# Altium footprint library ICs And Semiconductors THD.PcbLib: 507 footprints (part 26 of 32)
Each footprint in its own frame and in the unit in brackets; x right, y up, seen from the top. Pads: shape width x height; smd on the part's side, far side on the other; paste and mask are expansions set on the pad; w line width, h text height; cw(c..) or ccw(c..) is an arc to the next point about the centre after c.
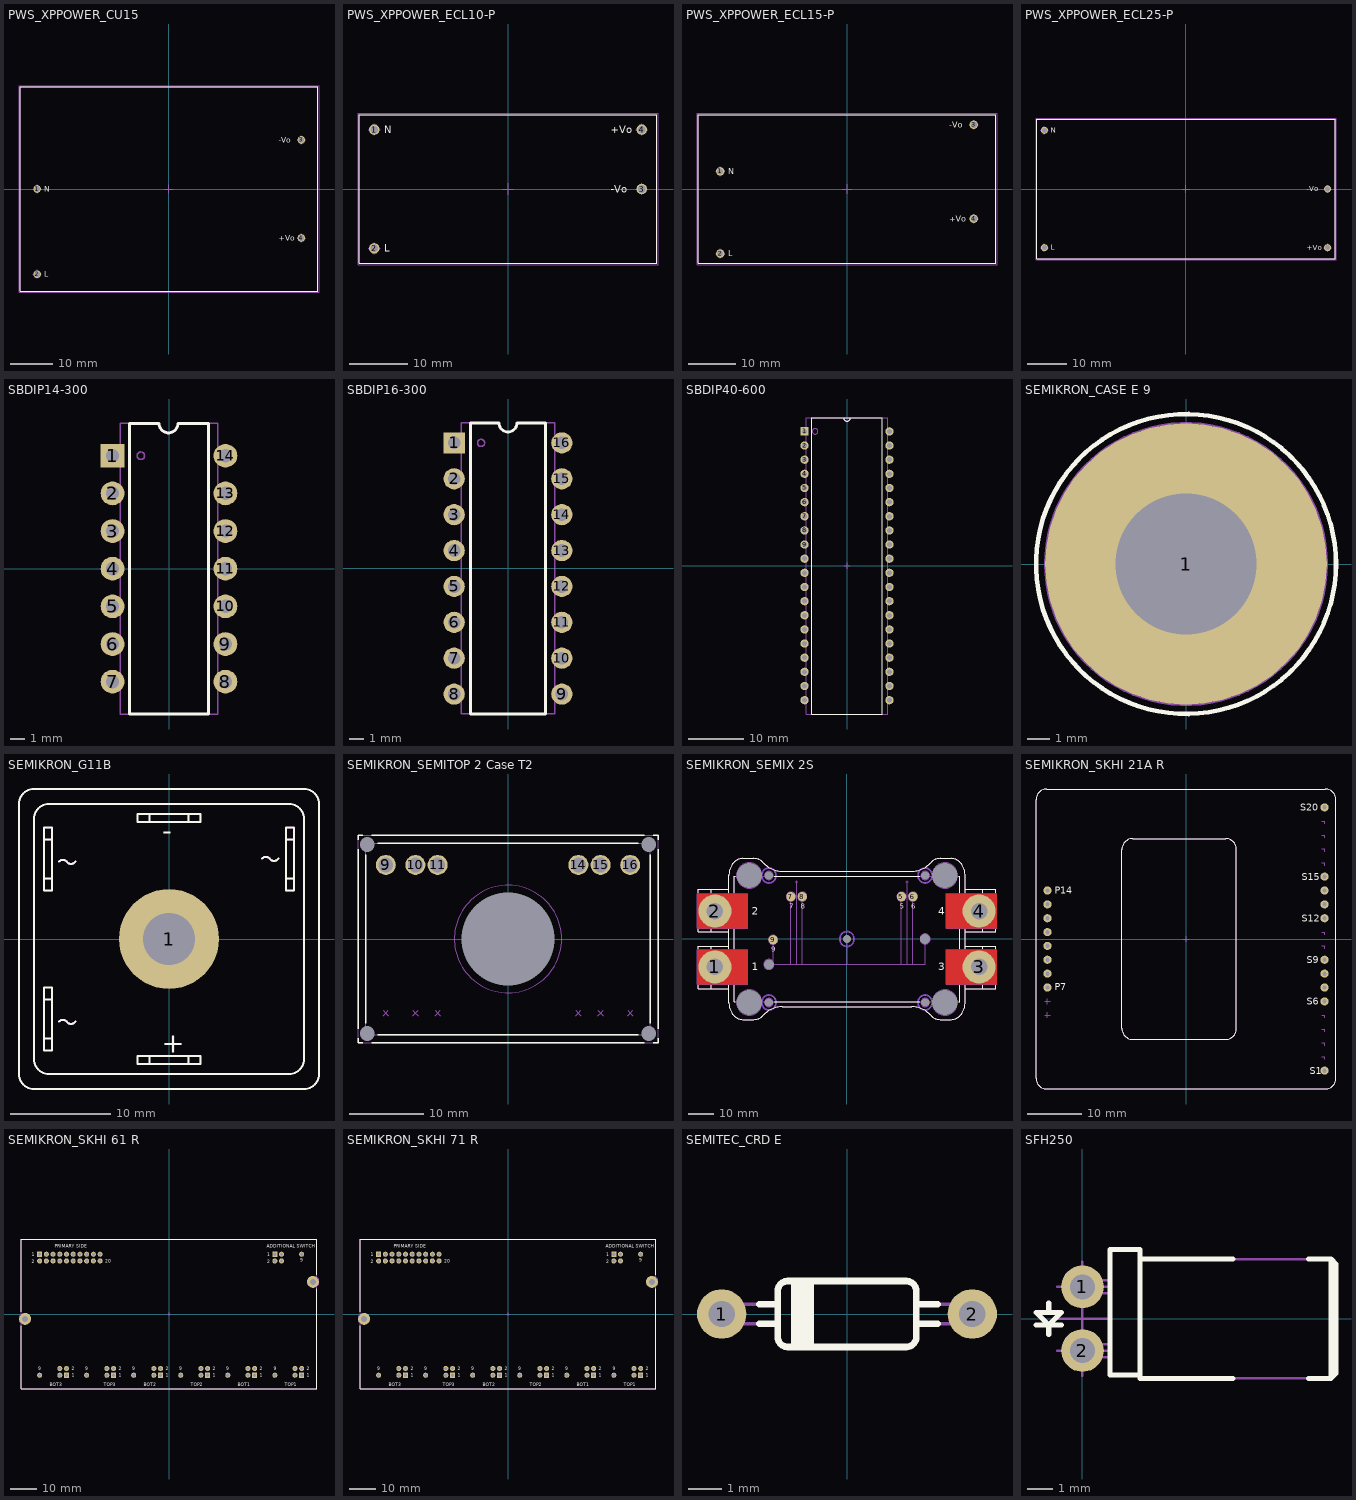
[diagram p25: the footprints below, top view; thin cyan lines are the x and y axes]

## PWS_XPPOWER_CU15 [mm] "CU15 Series , Body 69.9x48mm, Power Supply"
height 23
pads (4):
  round 1.8 hole 1.3: 1(-30.95,0) 2(-30.95,-20) 3(31.05,11.51) 4(31.05,-11.5)
Top Overlay:
  lines w0.2: -34.95,-24 34.95,-24 34.95,24 -34.95,24 -34.95,-24
  text "L" at -29.275,-20.59 h1.27
  text "N" at -29.275,-0.59 h1.27
  text "+Vo" at 25.775,-12.11 h1.27
  text "-Vo" at 25.775,10.9 h1.27
Notvisible:
  lines w0.2: -31.95,-20 -30.95,-20 ; -31.95,0 -30.95,0 ; -30.95,-21 -30.95,-20 ; -30.95,-19 -30.95,-20 ; -30.95,-1 -30.95,0 ; -30.95,1 -30.95,0 ; -29.95,-20 -30.95,-20 ; -29.95,0 -30.95,0 ; -1,0 0,0 ; 0,-1 0,0 ; 0,1 0,0 ; 1,0 0,0 ; 30.05,-11.5 31.05,-11.5 ; 30.05,11.51 31.05,11.51 ; 31.05,-12.5 31.05,-11.5 ; 31.05,-10.5 31.05,-11.5 ; 31.05,10.51 31.05,11.51 ; 31.05,12.51 31.05,11.51 ; 32.05,-11.5 31.05,-11.5 ; 32.05,11.51 31.05,11.51
Mechanical 14:
  lines w0.1: -34.95,-24 34.95,-24 34.95,24 -34.95,24 -34.95,-24
  text "L" at -29.275,-20.59 h1.27
  text "N" at -29.275,-0.59 h1.27
  text "+Vo" at 25.775,-12.11 h1.27
  text "-Vo" at 25.775,10.9 h1.27
Mechanical 15:
  lines w0.05: -35.2,-24.25 35.2,-24.25 35.2,24.25 -35.2,24.25 -35.2,-24.25
3D body: height 4.4, standoff 0, extent -31.85,-0.899 -30.051,0.899
3D body: height 0, standoff -3, extent -31.45,-0.499 -30.451,0.499
3D body: height 4.4, standoff 0, extent -31.85,-20.9 -30.051,-19.101
3D body: height 0, standoff -3, extent -31.45,-20.5 -30.451,-19.501
3D body: height 4.4, standoff 0, extent 30.151,-12.399 31.95,-10.601
3D body: height 0, standoff -3, extent 30.551,-11.999 31.55,-11.001
3D body: height 4.4, standoff 0, extent 30.151,10.611 31.95,12.41
3D body: height 0, standoff -3, extent 30.551,11.011 31.55,12.009
3D body: height 23, standoff 4.4, extent -34.95,-24 34.95,24

## PWS_XPPOWER_ECL10-P [mm] "ECL10-P Series , Body 50.8x25.4mm, Power Supply"
height 22.86
pads (4):
  round 1.8 hole 1.3: 1(-22.86,10.16) 2(-22.86,-10.16) 3(22.86,0) 4(22.86,10.16)
Top Overlay:
  lines w0.2: -25.4,-12.7 -25.4,12.7 25.4,12.7 25.4,-12.7 -25.4,-12.7
  text "L" at -21.185,-10.75 h1.27
  text "N" at -21.185,9.57 h1.27
  text "-Vo" at 17.585,-0.61 h1.27
  text "+Vo" at 17.585,9.55 h1.27
Notvisible:
  lines w0.1: -23.86,-10.16 -22.86,-10.16 ; -23.86,10.16 -22.86,10.16 ; -22.86,-11.16 -22.86,-10.16 ; -22.86,-9.16 -22.86,-10.16 ; -22.86,9.16 -22.86,10.16 ; -22.86,11.16 -22.86,10.16 ; -21.86,-10.16 -22.86,-10.16 ; -21.86,10.16 -22.86,10.16 ; -1,0 0,0 ; 0,-1 0,0 ; 0,1 0,0 ; 1,0 0,0 ; 21.86,0 22.86,0 ; 21.86,10.16 22.86,10.16 ; 22.86,-1 22.86,0 ; 22.86,1 22.86,0 ; 22.86,9.16 22.86,10.16 ; 22.86,11.16 22.86,10.16 ; 23.86,0 22.86,0 ; 23.86,10.16 22.86,10.16
  lines w0.2: -23.86,-10.16 -22.86,-10.16 ; -23.86,10.16 -22.86,10.16 ; -22.86,-11.16 -22.86,-10.16 ; -22.86,-9.16 -22.86,-10.16 ; -22.86,9.16 -22.86,10.16 ; -22.86,11.16 -22.86,10.16 ; -21.86,-10.16 -22.86,-10.16 ; -21.86,10.16 -22.86,10.16 ; 21.86,0 22.86,0 ; 21.86,10.16 22.86,10.16 ; 22.86,-1 22.86,0 ; 22.86,1 22.86,0 ; 22.86,9.16 22.86,10.16 ; 22.86,11.16 22.86,10.16 ; 23.86,0 22.86,0 ; 23.86,10.16 22.86,10.16
Mechanical 14:
  lines w0.1: -25.4,-12.7 -25.4,12.7 25.4,12.7 25.4,-12.7 -25.4,-12.7
  text "L" at -21.185,-10.75 h1.27
  text "N" at -21.185,9.57 h1.27
  text "-Vo" at 17.585,-0.61 h1.27
  text "+Vo" at 17.585,9.55 h1.27
Mechanical 15:
  lines w0.05: -25.65,-12.95 25.65,-12.95 25.65,12.95 -25.65,12.95 -25.65,-12.95
3D body: height 0, standoff -3, extent -23.36,-10.659 -22.361,-9.661
3D body: height 4.4, standoff 0, extent -23.76,-11.059 -21.961,-9.261
3D body: height 0, standoff -3, extent -23.36,9.661 -22.361,10.659
3D body: height 4.4, standoff 0, extent -23.76,9.261 -21.961,11.06
3D body: height 0, standoff -3, extent 22.361,-0.499 23.36,0.499
3D body: height 4.4, standoff 0, extent 21.961,-0.899 23.76,0.899
3D body: height 0, standoff -3, extent 22.361,9.661 23.36,10.659
3D body: height 4.4, standoff 0, extent 21.961,9.261 23.76,11.06
3D body: height 22.86, standoff 4.4, extent -25.45,-12.75 25.45,12.75

## PWS_XPPOWER_ECL15-P [mm] "ECL15-P Series , Body 63.5x31.75mm, Power Supply"
height 25.4
pads (4):
  round 1.8 hole 1.3: 1(-27.05,3.755) 2(-27.05,-13.775) 3(27.05,13.715) 4(27.05,-6.355)
Top Overlay:
  lines w0.2: -31.75,-15.875 31.75,-15.875 31.75,15.875 -31.75,15.875 -31.75,-15.875
  text "+Vo" at 21.775,-6.965 h1.27
  text "-Vo" at 21.775,13.105 h1.27
  text "N" at -25.375,3.165 h1.27
  text "L" at -25.375,-14.365 h1.27
Notvisible:
  lines w0.1: -28.05,-13.775 -27.05,-13.775 ; -28.05,3.755 -27.05,3.755 ; -27.05,-14.775 -27.05,-13.775 ; -27.05,-12.775 -27.05,-13.775 ; -27.05,2.755 -27.05,3.755 ; -27.05,4.755 -27.05,3.755 ; -26.05,-13.775 -27.05,-13.775 ; -26.05,3.755 -27.05,3.755 ; -1,0 0,0 ; 0,-1 0,0 ; 0,1 0,0 ; 1,0 0,0 ; 26.05,-6.355 27.05,-6.355 ; 26.05,13.715 27.05,13.715 ; 27.05,-7.355 27.05,-6.355 ; 27.05,-5.355 27.05,-6.355 ; 27.05,12.715 27.05,13.715 ; 27.05,14.715 27.05,13.715 ; 28.05,-6.355 27.05,-6.355 ; 28.05,13.715 27.05,13.715
Mechanical 14:
  lines w0.1: -31.75,-15.875 31.75,-15.875 31.75,15.875 -31.75,15.875 -31.75,-15.875
  text "+Vo" at 21.775,-6.965 h1.27
  text "-Vo" at 21.775,13.105 h1.27
  text "N" at -25.375,3.165 h1.27
  text "L" at -25.375,-14.365 h1.27
Mechanical 15:
  lines w0.05: -32,-16.125 -32,16.125 32,16.125 32,-16.125 -32,-16.125
3D body: height 25.4, standoff 4.4, extent -31.75,-15.874 31.75,15.875
3D body: height 0, standoff -3, extent 26.551,13.216 27.55,14.214
3D body: height 4.4, standoff 0, extent 26.151,12.816 27.95,14.614
3D body: height 0, standoff -3, extent 26.551,-6.854 27.55,-5.856
3D body: height 4.4, standoff 0, extent 26.151,-7.254 27.95,-5.456
3D body: height 0, standoff -3, extent -27.55,-14.274 -26.551,-13.276
3D body: height 4.4, standoff 0, extent -27.95,-14.674 -26.151,-12.876
3D body: height 0, standoff -3, extent -27.55,3.256 -26.551,4.254
3D body: height 4.4, standoff 0, extent -27.95,2.856 -26.151,4.654

## PWS_XPPOWER_ECL25-P [mm] "ECL25-P Series , Body 76.2x35.6mm, Power Supply"
height 26.7
pads (4):
  round 1.8 hole 1.3: 1(-36.2,15) 2(-36.2,-15) 3(36.195,0) 4(36.2,-15)
Top Overlay:
  lines w0.2: -38.1,-17.8 38.1,-17.8 38.1,17.8 -38.1,17.8 -38.1,-17.8
  text "+Vo" at 30.925,-15.61 h1.27
  text "-Vo" at 30.92,-0.61 h1.27
  text "N" at -34.525,14.41 h1.27
  text "L" at -34.525,-15.59 h1.27
Notvisible:
  lines w0.1: -37.2,-15 -36.2,-15 ; -37.2,15 -36.2,15 ; -36.2,-16 -36.2,-15 ; -36.2,-14 -36.2,-15 ; -36.2,14 -36.2,15 ; -36.2,16 -36.2,15 ; -35.2,-15 -36.2,-15 ; -35.2,15 -36.2,15 ; -1,0 0,0 ; 0,-1 0,0 ; 0,1 0,0 ; 1,0 0,0 ; 35.195,0 36.195,0 ; 35.2,-15 36.2,-15 ; 36.195,-1 36.195,0 ; 36.195,1 36.195,0 ; 36.2,-16 36.2,-15 ; 36.2,-14 36.2,-15 ; 37.195,0 36.195,0 ; 37.2,-15 36.2,-15
Mechanical 14:
  lines w0.1: -38.1,-17.8 38.1,-17.8 38.1,17.8 -38.1,17.8 -38.1,-17.8
  text "+Vo" at 30.925,-15.61 h1.27
  text "-Vo" at 30.92,-0.61 h1.27
  text "N" at -34.525,14.41 h1.27
  text "L" at -34.525,-15.59 h1.27
Mechanical 15:
  lines w0.05: -38.35,-18.05 38.35,-18.05 38.35,18.05 -38.35,18.05 -38.35,-18.05
3D body: height 0, standoff -3, extent 35.701,-0.499 36.7,0.499
3D body: height 4.4, standoff 0, extent 35.301,-0.899 37.1,0.899
3D body: height 0, standoff -3, extent 35.701,-15.499 36.7,-14.501
3D body: height 4.4, standoff 0, extent 35.301,-15.9 37.1,-14.101
3D body: height 0, standoff -3, extent -36.7,-15.499 -35.701,-14.501
3D body: height 4.4, standoff 0, extent -37.1,-15.9 -35.301,-14.101
3D body: height 0, standoff -3, extent -36.7,14.501 -35.701,15.499
3D body: height 4.4, standoff 0, extent -37.1,14.101 -35.301,15.9
3D body: height 26.7, standoff 4.4, extent -38.2,-17.9 38.2,17.9

## SBDIP14-300 [mm] "Side-Brazed Ceramic Dual In-Line Package (SBDIP) 14 Leads, Row Spacing 7.62 mm; Pitch 2.54 mm"
height 5.08
pads (14):
  rect 1.6x1.6 hole 0.9: 1(-3.81,7.62)
  round 1.6 hole 0.9: 2(-3.81,5.08) 3(-3.81,2.54) 4(-3.81,0) 5(-3.81,-2.54) 6(-3.81,-5.08) 7(-3.81,-7.62) 8(3.81,-7.62) 9(3.81,-5.08) 10(3.81,-2.54) 11(3.81,0) 12(3.81,2.54) 13(3.81,5.08) 14(3.81,7.62)
Top Overlay:
  lines w0.2: -0.685,9.8 -2.65,9.8 -2.65,-9.8 2.65,-9.8 2.65,9.8 ; -0.67,9.8 ccw(c-0.035,9.8) 0.6,9.8 2.615,9.8
Mechanical 14:
  circle w0.1: c-1.905,7.62 r0.254
  lines w0.1: -3.3,-9.8 3.3,-9.8 3.3,9.8 0.6,9.8 cw(c-0.035,9.8) -0.67,9.8 -3.3,9.8 -3.3,-9.8
3D body "SBDIP14-300.stp": height 5.08, standoff -3.81, extent -4.125,-9.715 4.125,9.715

## SBDIP16-300 [mm] "Side-Brazed Ceramic Dual In-Line Package (SBDIP) 16 Leads, Row Spacing 7.62 mm; Pitch 2.54 mm"
height 4.45
pads (16):
  rect 1.5x1.5 hole 0.9: 1(-3.81,8.89)
  round 1.5 hole 0.9: 2(-3.81,6.35) 3(-3.81,3.81) 4(-3.81,1.27) 5(-3.81,-1.27) 6(-3.81,-3.81) 7(-3.81,-6.35) 8(-3.81,-8.89) 9(3.81,-8.89) 10(3.81,-6.35) 11(3.81,-3.81) 12(3.81,-1.27) 13(3.81,1.27) 14(3.81,3.81) 15(3.81,6.35) 16(3.81,8.89)
Top Overlay:
  lines w0.2: -2.65,-10.3 -2.65,10.3 -0.635,10.3 ccw(c0,10.3) 0.635,10.3 2.65,10.3 2.65,-10.3 -2.65,-10.3
Mechanical 14:
  circle w0.1: c-1.905,8.89 r0.254
  lines w0.1: -3.3,-10.3 3.3,-10.3 3.3,10.3 0.6,10.3 cw(c-0.035,10.3) -0.67,10.3 -3.3,10.3 -3.3,-10.3
3D body "SBDIP16-300.stp": height 4.55, standoff -3.81, extent -4.125,-10.285 4.125,10.285

## SBDIP40-600 [mm] "40 Leads Side-Brazed Ceramic Dual In-Line Package (SBDIP), Row Spacing 15.24mm; Pitch 2.54mm"
height 5.72
pads (40):
  rect 1.5x1.5 hole 0.9: 1(-7.62,24.13)
  round 1.5 hole 0.9: 2(-7.62,21.59) 3(-7.62,19.05) 4(-7.62,16.51) 5(-7.62,13.97) 6(-7.62,11.43) 7(-7.62,8.89) 8(-7.62,6.35) 9(-7.62,3.81) 10(-7.62,1.27) 11(-7.62,-1.27) 12(-7.62,-3.81) 13(-7.62,-6.35) 14(-7.62,-8.89) 15(-7.62,-11.43) 16(-7.62,-13.97) 17(-7.62,-16.51) 18(-7.62,-19.05) 19(-7.62,-21.59) 20(-7.62,-24.13) 21(7.62,-24.13) 22(7.62,-21.59) 23(7.62,-19.05) 24(7.62,-16.51) 25(7.62,-13.97) 26(7.62,-11.43) 27(7.62,-8.89) 28(7.62,-6.35) 29(7.62,-3.81) 30(7.62,-1.27) 31(7.62,1.27) 32(7.62,3.81) 33(7.62,6.35) 34(7.62,8.89) 35(7.62,11.43) 36(7.62,13.97) 37(7.62,16.51) 38(7.62,19.05) 39(7.62,21.59) 40(7.62,24.13)
Top Overlay:
  lines w0.2: -0.635,26.62 ccw(c0,26.62) 0.635,26.62 ; -6.35,-26.62 6.35,-26.62 6.35,26.62 -6.35,26.62 -6.35,-26.62
Notvisible:
  drawing of 164 lines, arcs and shapes, not listed
Mechanical 14:
  circle w0.1: c-5.715,24.13 r0.5
  lines w0.1: -0.635,26.62 ccw(c0,26.62) 0.635,26.62 ; -7.34,-26.62 7.34,-26.62 7.34,26.62 -7.34,26.62 -7.34,-26.62
3D body "SBDIP40-600.stp": height 5.72, standoff -3.81, extent -7.85,-26.62 7.85,26.62

## SEMIKRON_CASE E 9 [mm] "SEMIKRON CASE E 9"
height 30.5
pads (1):
  round 12.4 hole 6.2: 1(0,0)
Top Overlay:
  circle w0.2: c0,0 r6.6
Notvisible:
  circle w0.1: c0,0 r3.1
  circle w0.1: c0,0 r6.2
  lines w0.1: -0.5,0 0,0 ; 0,-0.5 0,0 ; 0,0.5 0,0 ; 0.5,0 0,0
Mechanical 14:
  circle w0.1: c0,0 r5.25
  lines w0.1: -1,-0.75 cw(c0,0) 1,-0.75 ; -5.369,-3.1 -5.369,3.1 0,6.2 5.369,3.1 5.369,-3.1 0,-6.2 -5.369,-3.1 ; -1,-2.5 1,-2.5 1,0 ccw(c0,0) -1,0 -1,-2.5
3D body "SEMIKRON_CASE E 9_Part2.stp": height -2.5, standoff -10.4, extent -6.2,-6.2 6.2,6.2
3D body "SEMIKRON_CASE E 9_Part1.stp": height 30.5, standoff -11.5, extent -5.989,-5.989 5.989,5.989

## SEMIKRON_G11B [mm] "Three Phase Bridge Bridge, Body 28.8mm x 28.8mm G11b Case"
height 22.5
pads (1):
  round 10 hole 5.2: 1(0,0)
Top Overlay:
  lines w0.2: -12.5,-9.95 -11.7,-9.95 ; -12.5,-6.05 -11.7,-6.05 ; -12.5,6.05 -11.7,6.05 ; -12.5,9.95 -11.7,9.95 ; -10.975,-8.232 cw(c-10.615,-8.579) -10.2,-8.3 ; -10.975,7.768 cw(c-10.615,7.421) -10.2,7.7 ; -10.175,-8.32 ccw(c-9.794,-7.996) -9.365,-8.254 ; -10.175,7.68 ccw(c-9.794,8.004) -9.365,7.746 ; -1.95,-12.5 -1.95,-11.7 ; -1.95,11.7 -1.95,12.5 ; 1.95,-12.5 1.95,-11.7 ; 1.95,11.7 1.95,12.5 ; 9.325,8.068 cw(c9.685,7.721) 10.1,8 ; 10.125,7.98 ccw(c10.506,8.304) 10.935,8.046 ; 11.7,6.05 12.5,6.05 ; 11.7,9.95 12.5,9.95 ; -15,-13.5 ccw(c-13.5,-13.5) -13.5,-15 13.5,-15 ccw(c13.5,-13.5) 15,-13.5 15,13.5 ccw(c13.5,13.5) 13.5,15 -13.5,15 ccw(c-13.5,13.5) -15,13.5 -15,-13.5 ; -13.5,-12 ccw(c-12,-12) -12,-13.5 12,-13.5 ccw(c12,-12) 13.5,-12 13.5,12 ccw(c12,12) 12,13.5 -12,13.5 ccw(c-12,12) -13.5,12 -13.5,-12 ; -12.5,-11.15 -11.7,-11.15 -11.7,-4.85 -12.5,-4.85 -12.5,-11.15 ; -12.5,4.85 -11.7,4.85 -11.7,11.15 -12.5,11.15 -12.5,4.85 ; -3.15,-12.5 -3.15,-11.7 3.15,-11.7 3.15,-12.5 -3.15,-12.5 ; -3.15,11.7 -3.15,12.5 3.15,12.5 3.15,11.7 -3.15,11.7 ; 11.7,4.85 12.5,4.85 12.5,11.15 11.7,11.15 11.7,4.85
  text "+" at -0.7,-11.4 h2
  text "-" at -0.7,9.9 h2
Notvisible:
  lines w0.1: -1,0 0,0 ; 0,-1 0,0 ; 0,1 0,0 ; 1,0 0,0
Mechanical 14:
  circle w0.1: c0,0 r2.6
  circle w0.1: c0,0 r4.1
  circle w0.1: c0,0 r2.6
  lines w0.1: -12.5,-9.95 -11.7,-9.95 ; -12.5,-6.05 -11.7,-6.05 ; -12.5,6.05 -11.7,6.05 ; -12.5,9.95 -11.7,9.95 ; -1.95,-12.5 -1.95,-11.7 ; -1.95,11.7 -1.95,12.5 ; 1.95,-12.5 1.95,-11.7 ; 1.95,11.7 1.95,12.5 ; 11.7,6.05 12.5,6.05 ; 11.7,9.95 12.5,9.95 ; -15,-13.5 ccw(c-13.5,-13.5) -13.5,-15 13.5,-15 ccw(c13.5,-13.5) 15,-13.5 15,13.5 ccw(c13.5,13.5) 13.5,15 -13.5,15 ccw(c-13.5,13.5) -15,13.5 -15,-13.5 ; -13.5,-12 ccw(c-12,-12) -12,-13.5 12,-13.5 ccw(c12,-12) 13.5,-12 13.5,12 ccw(c12,12) 12,13.5 -12,13.5 ccw(c-12,12) -13.5,12 -13.5,-12 ; -12.5,-11.15 -11.7,-11.15 -11.7,-4.85 -12.5,-4.85 -12.5,-11.15 ; -12.5,4.85 -11.7,4.85 -11.7,11.15 -12.5,11.15 -12.5,4.85 ; -3.15,-12.5 -3.15,-11.7 3.15,-11.7 3.15,-12.5 -3.15,-12.5 ; -3.15,11.7 -3.15,12.5 3.15,12.5 3.15,11.7 -3.15,11.7 ; 11.7,4.85 12.5,4.85 12.5,11.15 11.7,11.15 11.7,4.85
  lines w0.2: -10.975,-8.232 cw(c-10.615,-8.579) -10.2,-8.3 ; -10.975,-8.232 cw(c-10.615,-8.579) -10.2,-8.3 ; -10.975,-8.232 cw(c-10.615,-8.579) -10.2,-8.3 ; -10.975,7.768 cw(c-10.615,7.421) -10.2,7.7 ; -10.975,7.768 cw(c-10.615,7.421) -10.2,7.7 ; -10.975,7.768 cw(c-10.615,7.421) -10.2,7.7 ; -10.175,-8.32 ccw(c-9.794,-7.996) -9.365,-8.254 ; -10.175,-8.32 ccw(c-9.794,-7.996) -9.365,-8.254 ; -10.175,-8.32 ccw(c-9.794,-7.996) -9.365,-8.254 ; -10.175,7.68 ccw(c-9.794,8.004) -9.365,7.746 ; -10.175,7.68 ccw(c-9.794,8.004) -9.365,7.746 ; -10.175,7.68 ccw(c-9.794,8.004) -9.365,7.746 ; 9.325,8.068 cw(c9.685,7.721) 10.1,8 ; 9.325,8.068 cw(c9.685,7.721) 10.1,8 ; 9.325,8.068 cw(c9.685,7.721) 10.1,8 ; 10.125,7.98 ccw(c10.506,8.304) 10.935,8.046 ; 10.125,7.98 ccw(c10.506,8.304) 10.935,8.046 ; 10.125,7.98 ccw(c10.506,8.304) 10.935,8.046
  text "+" at -0.7,-11.4 h2
  text "-" at -0.7,9.9 h2
  text "-" at -0.7,9.9 h2
  text "+" at -0.7,-11.4 h2
  text "+" at -0.7,-11.4 h2
  text "-" at -0.7,9.9 h2
3D body "SEMIKRON_CASE G11B.stp": height 22.5, standoff 0, extent -15,-15 15,15

## SEMIKRON_SEMITOP 2 Case T2 [mm] "SEMIKRON SEMITOP 2 Case T2"
height 10.5
pads (11):
  round 2.7 hole 2: 9(-16.5,10) 10(-12.5,10) 11(-9.5,10) 14(9.5,10) 15(12.5,10) 16(16.5,10)
  round 1 hole 2 unplated mask+0.5: MECH1(-19,12.75) MECH2(-19,-12.75) MECH3(19,-12.75) MECH4(19,12.75)
  round 1 hole 12.5 unplated mask+5.75: MECH5(0,0)
Top Overlay:
  lines w0.2: -20.25,-13.38 -20.25,-14 -19.63,-14 ; -20.25,-12.12 -20.25,12.12 ; -20.25,13.38 -20.25,14 -19.63,14 ; -19.2,-11.364 -19.2,11.364 ; -18.37,-14 18.37,-14 ; -18.37,14 18.37,14 ; -17.614,-12.95 17.614,-12.95 ; -17.614,12.95 17.614,12.95 ; 19.2,-11.364 19.2,11.364 ; 19.63,-14 20.25,-14 20.25,-13.38 ; 19.63,14 20.25,14 20.25,13.38 ; 20.25,-12.12 20.25,12.12
Notvisible:
  circle w0.1: c0,0 r7.25
  circle w0.1: c0,0 r6
  lines w0.1: -19.5,-12.75 -19,-12.75 ; -19.5,12.75 -19,12.75 ; -19,-13.25 -19,-12.75 ; -19,-12.25 -19,-12.75 ; -19,12.25 -19,12.75 ; -19,13.25 -19,12.75 ; -18.5,-12.75 -19,-12.75 ; -18.5,12.75 -19,12.75 ; -17,10 -16.5,10 ; -16.854,-10.354 -16.5,-10 ; -16.854,-9.646 -16.5,-10 ; -16.5,9.5 -16.5,10 ; -16.5,10.5 -16.5,10 ; -16.146,-10.354 -16.5,-10 ; -16.146,-9.646 -16.5,-10 ; -16,10 -16.5,10 ; -13,10 -12.5,10 ; -12.854,-10.354 -12.5,-10 ; -12.854,-9.646 -12.5,-10 ; -12.5,9.5 -12.5,10 ; -12.5,10.5 -12.5,10 ; -12.146,-10.354 -12.5,-10 ; -12.146,-9.646 -12.5,-10 ; -12,10 -12.5,10 ; -10,10 -9.5,10 ; -9.854,-10.354 -9.5,-10 ; -9.854,-9.646 -9.5,-10 ; -9.5,9.5 -9.5,10 ; -9.5,10.5 -9.5,10 ; -9.146,-10.354 -9.5,-10 ; -9.146,-9.646 -9.5,-10 ; -9,10 -9.5,10 ; 9,10 9.5,10 ; 9.146,-10.354 9.5,-10 ; 9.146,-9.646 9.5,-10 ; 9.5,9.5 9.5,10 ; 9.5,10.5 9.5,10 ; 9.854,-10.354 9.5,-10 ; 9.854,-9.646 9.5,-10 ; 10,10 9.5,10 ; 12,10 12.5,10 ; 12.146,-10.354 12.5,-10 ; 12.146,-9.646 12.5,-10 ; 12.5,9.5 12.5,10 ; 12.5,10.5 12.5,10 ; 12.854,-10.354 12.5,-10 ; 12.854,-9.646 12.5,-10 ; 13,10 12.5,10 ; 16,10 16.5,10 ; 16.146,-10.354 16.5,-10 ; 16.146,-9.646 16.5,-10 ; 16.5,9.5 16.5,10 ; 16.5,10.5 16.5,10 ; 16.854,-10.354 16.5,-10 ; 16.854,-9.646 16.5,-10 ; 17,10 16.5,10 ; 18.5,-12.75 19,-12.75 ; 18.5,12.75 19,12.75 ; 19,-13.25 19,-12.75 ; 19,-12.25 19,-12.75 ; 19,12.25 19,12.75 ; 19,13.25 19,12.75 ; 19.5,-12.75 19,-12.75 ; 19.5,12.75 19,12.75 ; 0,0 0,-0.5 0,0 ; 0,0 -0.5,0 0,0 ; 0,0 0,0.5 0,0 ; 0,0 0.5,0 0,0
Mechanical 14:
  circle w0.1: c0,0 r2.2
  lines w0.1: -20.25,-14 20.25,-14 20.25,14 -20.25,14 -20.25,-14 ; -19.2,-12.95 19.2,-12.95 19.2,12.95 -19.2,12.95 -19.2,-12.95
3D body "SEMIKRON_SEMITOP 2 Case T2.stp": height 12, standoff -3.5, extent -20.25,-14 20.25,14

## SEMIKRON_SEMIX 2S [mm] "SEMIKRON SEMIX 2s Case"
height 17.5
pads (20):
  round 13 hole 6.5: 1(-52,-11) 2(-52,11) 3(52,-11) 4(52,11)
  round 3.6 smd: 5(21.45,16.7) 6(25.95,16.7) 7(-22.1,16.7) 8(-17.6,16.7) 9(-29.1,-0.3)
  round 1 hole 3.3 unplated mask+1.15: 10(-30.75,25) 11(-30.75,-25) 12(30.75,-25) 13(30.75,25) 14(0,0)
  round 1 hole 4 unplated mask+1.5: 15(-30.75,-10) 16(30.75,0)
  round 1 hole 10 unplated mask+4.5: 17(-38.5,25) 18(-38.5,-25) 19(38.5,-25) 20(38.5,25)
Top Layer:
  region: 39.05,-17.75 59.05,-17.75 59.05,-4.25 39.05,-4.25
  region: 39.05,4.25 59.05,4.25 59.05,17.75 39.05,17.75
  region: -59.05,-17.75 -39.05,-17.75 -39.05,-4.25 -59.05,-4.25
  region: -59.05,4.25 -39.05,4.25 -39.05,17.75 -59.05,17.75
Bottom Layer keep-out:
  circle w0.1: c0,0 r3
  circle w0.1: c-30.75,-25 r3
  circle w0.1: c30.75,-25 r3
  circle w0.1: c30.75,25 r3
  circle w0.1: c-30.75,25 r3
Top Overlay:
  lines w0.2: -58.5,-18.15 -58.5,-19.5 -46.5,-19.5 ; -58.5,-3.85 -58.5,-2.8 -46.5,-2.8 ; -58.5,3.85 -58.5,2.8 -46.5,2.8 ; -58.5,18.15 -58.5,19.5 -46.5,19.5 ; -53.5,-19.5 -53.5,-18.15 ; -53.5,-3.85 -53.5,-2.8 ; -53.5,2.8 -53.5,3.85 ; -53.5,18.15 -53.5,19.5 ; -46.5,-18.15 -46.5,-25 ccw(c-38.5,-25) -45.092,-29.533 ccw(c-40.972,-26.7) -40.972,-31.7 -36.68,-31.7 ccw(c-36.68,-26.7) -32.954,-30.033 cw(c-25.5,-36.7) -25.5,-26.7 25.5,-26.7 cw(c25.5,-36.7) 32.954,-30.033 ccw(c36.68,-26.7) 36.68,-31.7 40.972,-31.7 ccw(c40.972,-26.7) 45.092,-29.533 ccw(c38.5,-25) 46.5,-25 46.5,-18.15 ; -46.5,-3.85 -46.5,3.85 ; -46.5,18.15 -46.5,25 cw(c-38.5,25) -45.092,29.533 cw(c-40.972,26.7) -40.972,31.7 -36.68,31.7 cw(c-36.68,26.7) -32.954,30.033 ccw(c-25.5,36.7) -25.5,26.7 25.5,26.7 ccw(c25.5,36.7) 32.954,30.033 cw(c36.68,26.7) 36.68,31.7 40.972,31.7 cw(c40.972,26.7) 45.092,29.533 cw(c38.5,25) 46.5,25 46.5,18.15 ; -44.45,-18.15 -44.45,-24.8 -43.996,-24.8 ; -44.45,-3.85 -44.45,3.85 ; -44.45,18.15 -44.45,24.8 -43.996,24.8 ; -28.71,-24.8 28.71,-24.8 ; -28.71,24.8 28.71,24.8 ; 43.996,-24.8 44.45,-24.8 44.45,-18.15 ; 43.996,24.8 44.45,24.8 44.45,18.15 ; 44.45,-3.85 44.45,3.85 ; 46.5,-19.5 58.5,-19.5 58.5,-18.15 ; 46.5,-3.85 46.5,3.85 ; 46.5,-2.8 58.5,-2.8 58.5,-3.85 ; 46.5,2.8 58.5,2.8 58.5,3.85 ; 46.5,19.5 58.5,19.5 58.5,18.15 ; 53.5,-19.5 53.5,-18.15 ; 53.5,-3.85 53.5,-2.8 ; 53.5,2.8 53.5,3.85 ; 53.5,18.15 53.5,19.5
  text "9" at -29.8,-5.075 h2
  text "3" at 35.975,-12.3 h3
  text "4" at 35.952,9.5 h3
  text "1" at -37.413,-12.4 h3
  text "2" at -37.5,9.5 h3
  text "6" at 25.25,11.925 h2
  text "5" at 20.75,11.925 h2
  text "8" at -18.259,11.925 h2
  text "7" at -22.81,11.925 h2
Notvisible:
  circle w0.1: c-38.5,25 r5
  circle w0.1: c-38.5,-25 r5
  circle w0.1: c38.5,-25 r5
  circle w0.1: c38.5,25 r5
  circle w0.1: c-29.1,-0.3 r1.8
  circle w0.1: c25.95,16.7 r1.8
  circle w0.1: c21.45,16.7 r1.8
  circle w0.1: c-17.6,16.7 r1.8
  circle w0.1: c-22.1,16.7 r1.8
  circle w0.1: c-30.75,25 r1.65
  circle w0.1: c30.75,25 r1.65
  circle w0.1: c30.75,-25 r1.65
  circle w0.1: c-30.75,-25 r1.65
  circle w0.1: c-30.75,-10 r2
  circle w0.1: c30.75,0 r2
  circle w0.1: c-52,11 r3.25
  circle w0.1: c-52,-11 r3.25
  circle w0.1: c52,-11 r3.25
  circle w0.1: c52,11 r3.25
  circle w0.1: c30.75,-25 r2.75
  circle w0.1: c-30.75,-25 r2.75
  circle w0.1: c-30.75,25 r2.75
  circle w0.1: c30.75,25 r2.75
  circle w0.1: c0,0 r2.75
  lines w0.1: -52.5,-11 -52,-11 ; -52.5,11 -52,11 ; -52,-11.5 -52,-11 ; -52,-10.5 -52,-11 ; -52,10.5 -52,11 ; -52,11.5 -52,11 ; -51.5,-11 -52,-11 ; -51.5,11 -52,11 ; -39,-25 -38.5,-25 ; -39,25 -38.5,25 ; -38.5,-25.5 -38.5,-25 ; -38.5,-24.5 -38.5,-25 ; -38.5,24.5 -38.5,25 ; -38.5,25.5 -38.5,25 ; -38,-25 -38.5,-25 ; -38,25 -38.5,25 ; -31.25,-25 -30.75,-25 ; -31.25,-10 -30.75,-10 ; -31.25,25 -30.75,25 ; -30.75,-25.5 -30.75,-25 ; -30.75,-24.5 -30.75,-25 ; -30.75,-10.5 -30.75,-10 ; -30.75,-9.5 -30.75,-10 ; -30.75,24.5 -30.75,25 ; -30.75,25.5 -30.75,25 ; -30.25,-25 -30.75,-25 ; -30.25,-10 -30.75,-10 ; -30.25,25 -30.75,25 ; -29.6,-0.3 -29.1,-0.3 ; -29.1,-10 -29.1,-0.3 ; -29.1,-0.8 -29.1,-0.3 ; -29.1,0.2 -29.1,-0.3 ; -28.6,-0.3 -29.1,-0.3 ; -22.6,16.7 -22.1,16.7 ; -22.1,-10 -22.1,16.7 ; -22.1,16.2 -22.1,16.7 ; -22.1,17.2 -22.1,16.7 ; -21.6,16.7 -22.1,16.7 ; -20.35,22.45 -19.85,22.45 ; -19.85,-10 -19.85,22.45 ; -19.85,21.95 -19.85,22.45 ; -19.85,22.95 -19.85,22.45 ; -19.35,22.45 -19.85,22.45 ; -18.1,16.7 -17.6,16.7 ; -17.6,-10 -17.6,16.7 ; -17.6,16.2 -17.6,16.7 ; -17.6,17.2 -17.6,16.7 ; -17.1,16.7 -17.6,16.7 ; -0.5,0 0,0 ; 0,-10 0,0 ; 0,-0.5 0,0 ; 0,0.5 0,0 ; 0.5,0 0,0 ; 20.95,16.7 21.45,16.7 ; 21.45,-10 21.45,16.7 ; 21.45,16.2 21.45,16.7 ; 21.45,17.2 21.45,16.7 ; 21.95,16.7 21.45,16.7 ; 23.2,22.45 23.7,22.45 ; 23.7,-10 23.7,22.45 ; 23.7,21.95 23.7,22.45 ; 23.7,22.95 23.7,22.45 ; 24.2,22.45 23.7,22.45 ; 25.45,16.7 25.95,16.7 ; 25.95,-10 25.95,16.7 ; 25.95,16.2 25.95,16.7 ; 25.95,17.2 25.95,16.7 ; 26.45,16.7 25.95,16.7 ; 30.25,-25 30.75,-25 ; 30.25,0 30.75,0 ; 30.25,25 30.75,25 ; 30.75,-25.5 30.75,-25 ; 30.75,-24.5 30.75,-25 ; 30.75,-0.5 30.75,0 ; 30.75,0.5 30.75,0 ; 30.75,24.5 30.75,25 ; 30.75,25.5 30.75,25 ; 31.25,-25 30.75,-25 ; 31.25,0 30.75,0 ; 31.25,25 30.75,25 ; 38,-25 38.5,-25 ; 38,25 38.5,25 ; 38.5,-25.5 38.5,-25 ; 38.5,-24.5 38.5,-25 ; 38.5,24.5 38.5,25 ; 38.5,25.5 38.5,25 ; 39,-25 38.5,-25 ; 39,25 38.5,25 ; 51.5,-11 52,-11 ; 51.5,11 52,11 ; 52,-11.5 52,-11 ; 52,-10.5 52,-11 ; 52,10.5 52,11 ; 52,11.5 52,11 ; 52.5,-11 52,-11 ; 52.5,11 52,11 ; -59.05,-17.75 -39.05,-17.75 -39.05,-4.25 -59.05,-4.25 ; -59.05,-17.75 -59.05,-4.25 ; -59.05,-17.75 -49.05,-11 -59.05,-4.25 ; -59.05,4.25 -59.05,17.75 ; -59.05,4.25 -39.05,4.25 -39.05,17.75 -59.05,17.75 ; -59.05,4.25 -49.05,11 -59.05,17.75 ; -30.75,-10 30.75,-10 30.75,0 ; 59.05,-17.75 39.05,-17.75 39.05,-4.25 59.05,-4.25 ; 59.05,-17.75 59.05,-4.25 ; 59.05,-17.75 49.05,-11 59.05,-4.25 ; 59.05,4.25 39.05,4.25 39.05,17.75 59.05,17.75 ; 59.05,4.25 59.05,17.75 ; 59.05,4.25 49.05,11 59.05,17.75
Mechanical 14:
  circle w0.1: c-38.5,25 r3.4
  circle w0.1: c-38.5,25 r2.7
  circle w0.1: c38.5,25 r3.4
  circle w0.1: c38.5,25 r2.7
  circle w0.1: c38.5,-25 r3.4
  circle w0.1: c38.5,-25 r2.7
  circle w0.1: c-38.5,-25 r3.4
  circle w0.1: c-38.5,-25 r2.7
  lines w0.1: -53.5,-19.5 -53.5,-2.8 ; -53.5,2.8 -53.5,19.5 ; -46.5,-19.5 -58.5,-19.5 -58.5,-2.8 -46.5,-2.8 ; -46.5,2.8 -58.5,2.8 -58.5,19.5 -46.5,19.5 ; 46.5,-19.5 58.5,-19.5 58.5,-2.8 46.5,-2.8 ; 46.5,2.8 58.5,2.8 58.5,19.5 46.5,19.5 ; 53.5,-19.5 53.5,-2.8 ; 53.5,2.8 53.5,19.5 ; -58.05,-16.75 -40.05,-16.75 -40.05,-5.25 -58.05,-5.25 -58.05,-16.75 ; -58.05,5.25 -58.05,16.75 -40.05,16.75 -40.05,5.25 -58.05,5.25 ; -46.5,-25 ccw(c-38.5,-25) -45.092,-29.533 ccw(c-40.972,-26.7) -40.972,-31.7 -36.68,-31.7 ccw(c-36.68,-26.7) -32.954,-30.033 cw(c-25.5,-36.7) -25.5,-26.7 25.5,-26.7 cw(c25.5,-36.7) 32.954,-30.033 ccw(c36.68,-26.7) 36.68,-31.7 40.972,-31.7 ccw(c40.972,-26.7) 45.092,-29.533 ccw(c38.5,-25) 46.5,-25 46.5,25 ccw(c38.5,25) 45.092,29.533 ccw(c40.972,26.7) 40.972,31.7 36.68,31.7 ccw(c36.68,26.7) 32.954,30.033 cw(c25.5,36.7) 25.5,26.7 -25.5,26.7 cw(c-25.5,36.7) -32.954,30.033 ccw(c-36.68,26.7) -36.68,31.7 -40.972,31.7 ccw(c-40.972,26.7) -45.092,29.533 ccw(c-38.5,25) -46.5,25 -46.5,-25 ; -44.45,-24.8 -44.45,24.8 -41.994,24.8 ccw(c-38.5,25) -35.006,24.8 35.006,24.8 ccw(c38.5,25) 41.994,24.8 44.45,24.8 44.45,-24.8 41.994,-24.8 ccw(c38.5,-24.992) 35.006,-24.8 -35.006,-24.8 ccw(c-38.5,-25) -41.994,-24.8 -44.45,-24.8 ; 40.05,-16.75 40.05,-5.25 58.05,-5.25 58.05,-16.75 40.05,-16.75 ; 40.05,5.25 40.05,16.75 58.05,16.75 58.05,5.25 40.05,5.25
  text "9" at -29.8,-5.075 h2
  text "3" at 35.975,-12.3 h3
  text "4" at 35.952,9.5 h3
  text "1" at -37.413,-12.4 h3
  text "2" at -37.5,9.5 h3
  text "6" at 25.25,11.925 h2
  text "5" at 20.75,11.925 h2
  text "8" at -18.259,11.925 h2
  text "7" at -22.81,11.925 h2
3D body "SEMIKRON_SEMIX 2S.stp": height 17.5, standoff -5.5, extent -58.5,-31.7 58.5,31.7

## SEMIKRON_SKHI 21A R [mm] "SEMIKRON SKHI 21A R Case"
height 16
pads (18):
  round 1.5 hole 0.8: P7(-25.4,-8.89) P8(-25.4,-6.35) P9(-25.4,-3.81) P10(-25.4,-1.27) P11(-25.4,1.27) P12(-25.4,3.81) P13(-25.4,6.35) P14(-25.4,8.89) S1(25.4,-24.13) S6(25.4,-11.43) S7(25.4,-8.89) S8(25.4,-6.35) S9(25.4,-3.81) S12(25.4,3.81) S13(25.4,6.35) S14(25.4,8.89) S15(25.4,11.43) S20(25.4,24.13)
Top Overlay:
  lines w0.2: -27.5,-25.5 ccw(c-25.5,-25.5) -25.5,-27.5 25.5,-27.5 ccw(c25.5,-25.5) 27.5,-25.5 27.5,25.5 ccw(c25.5,25.5) 25.5,27.5 -25.5,27.5 ccw(c-25.5,25.5) -27.5,25.5 -27.5,-25.5 ; -11.75,-16.4 ccw(c-9.75,-16.4) -9.75,-18.4 7.25,-18.4 ccw(c7.25,-16.4) 9.25,-16.4 9.25,16.4 ccw(c7.25,16.4) 7.25,18.4 -9.75,18.4 ccw(c-9.75,16.4) -11.75,16.4 -11.75,-16.4
  text "P7" at -24.08,-9.44 h1.27
  text "P14" at -24.08,8.34 h1.27
  text "S20" at 20.98,23.48 h1.27
  text "S15" at 21.18,10.78 h1.27
  text "S12" at 21.227,3.16 h1.27
  text "S9" at 22.18,-4.46 h1.27
  text "S6" at 22.18,-12.08 h1.27
  text "S1" at 22.68,-24.78 h1.27
Notvisible:
  lines w0.1: -25.9,-13.97 -25.4,-13.97 ; -25.9,-11.43 -25.4,-11.43 ; -25.9,-8.89 -25.4,-8.89 ; -25.9,-6.35 -25.4,-6.35 ; -25.9,-3.81 -25.4,-3.81 ; -25.9,-1.27 -25.4,-1.27 ; -25.9,1.27 -25.4,1.27 ; -25.9,3.81 -25.4,3.81 ; -25.9,6.35 -25.4,6.35 ; -25.9,8.89 -25.4,8.89 ; -25.4,-14.47 -25.4,-13.97 ; -25.4,-13.47 -25.4,-13.97 ; -25.4,-11.93 -25.4,-11.43 ; -25.4,-10.93 -25.4,-11.43 ; -25.4,-9.39 -25.4,-8.89 ; -25.4,-8.39 -25.4,-8.89 ; -25.4,-6.85 -25.4,-6.35 ; -25.4,-5.85 -25.4,-6.35 ; -25.4,-4.31 -25.4,-3.81 ; -25.4,-3.31 -25.4,-3.81 ; -25.4,-1.77 -25.4,-1.27 ; -25.4,-0.77 -25.4,-1.27 ; -25.4,0.77 -25.4,1.27 ; -25.4,1.77 -25.4,1.27 ; -25.4,3.31 -25.4,3.81 ; -25.4,4.31 -25.4,3.81 ; -25.4,5.85 -25.4,6.35 ; -25.4,6.85 -25.4,6.35 ; -25.4,8.39 -25.4,8.89 ; -25.4,9.39 -25.4,8.89 ; -24.9,-13.97 -25.4,-13.97 ; -24.9,-11.43 -25.4,-11.43 ; -24.9,-8.89 -25.4,-8.89 ; -24.9,-6.35 -25.4,-6.35 ; -24.9,-3.81 -25.4,-3.81 ; -24.9,-1.27 -25.4,-1.27 ; -24.9,1.27 -25.4,1.27 ; -24.9,3.81 -25.4,3.81 ; -24.9,6.35 -25.4,6.35 ; -24.9,8.89 -25.4,8.89 ; -0.5,0 0,0 ; 0,-0.5 0,0 ; 0,0.5 0,0 ; 0.5,0 0,0 ; 24.9,-24.13 25.4,-24.13 ; 24.9,-21.59 25.4,-21.59 25.4,-22.09 ; 24.9,-19.05 25.4,-19.05 25.4,-19.55 ; 24.9,-16.51 25.4,-16.51 25.4,-17.01 ; 24.9,-13.97 25.4,-13.97 25.4,-14.47 ; 24.9,-11.43 25.4,-11.43 ; 24.9,-8.89 25.4,-8.89 ; 24.9,-6.35 25.4,-6.35 ; 24.9,-3.81 25.4,-3.81 ; 24.9,-1.27 25.4,-1.27 25.4,-1.77 ; 24.9,1.27 25.4,1.27 25.4,0.77 ; 24.9,3.81 25.4,3.81 ; 24.9,6.35 25.4,6.35 ; 24.9,8.89 25.4,8.89 ; 24.9,11.43 25.4,11.43 ; 24.9,13.97 25.4,13.97 25.4,13.47 ; 24.9,16.51 25.4,16.51 25.4,16.01 ; 24.9,19.05 25.4,19.05 25.4,18.55 ; 24.9,21.59 25.4,21.59 25.4,21.09 ; 24.9,24.13 25.4,24.13 ; 25.4,-24.63 25.4,-24.13 ; 25.4,-23.63 25.4,-24.13 ; 25.4,-11.93 25.4,-11.43 ; 25.4,-10.93 25.4,-11.43 ; 25.4,-9.39 25.4,-8.89 ; 25.4,-8.39 25.4,-8.89 ; 25.4,-6.85 25.4,-6.35 ; 25.4,-5.85 25.4,-6.35 ; 25.4,-4.31 25.4,-3.81 ; 25.4,-3.31 25.4,-3.81 ; 25.4,3.31 25.4,3.81 ; 25.4,4.31 25.4,3.81 ; 25.4,5.85 25.4,6.35 ; 25.4,6.85 25.4,6.35 ; 25.4,8.39 25.4,8.89 ; 25.4,9.39 25.4,8.89 ; 25.4,10.93 25.4,11.43 ; 25.4,11.93 25.4,11.43 ; 25.4,23.63 25.4,24.13 ; 25.4,24.63 25.4,24.13 ; 25.9,-24.13 25.4,-24.13 ; 25.9,-11.43 25.4,-11.43 ; 25.9,-8.89 25.4,-8.89 ; 25.9,-6.35 25.4,-6.35 ; 25.9,-3.81 25.4,-3.81 ; 25.9,3.81 25.4,3.81 ; 25.9,6.35 25.4,6.35 ; 25.9,8.89 25.4,8.89 ; 25.9,11.43 25.4,11.43 ; 25.9,24.13 25.4,24.13
Mechanical 14:
  lines w0.1: -27.5,-25.5 ccw(c-25.5,-25.5) -25.5,-27.5 25.5,-27.5 ccw(c25.5,-25.5) 27.5,-25.5 27.5,25.5 ccw(c25.5,25.5) 25.5,27.5 -25.5,27.5 ccw(c-25.5,25.5) -27.5,25.5 -27.5,-25.5 ; -11.75,-16.4 ccw(c-9.75,-16.4) -9.75,-18.4 7.25,-18.4 ccw(c7.25,-16.4) 9.25,-16.4 9.25,16.4 ccw(c7.25,16.4) 7.25,18.4 -9.75,18.4 ccw(c-9.75,16.4) -11.75,16.4 -11.75,-16.4
  text "P7" at -24.08,-9.44 h1.27
  text "P14" at -24.08,8.34 h1.27
  text "S20" at 20.98,23.48 h1.27
  text "S15" at 21.18,10.78 h1.27
  text "S12" at 21.227,3.16 h1.27
  text "S9" at 22.18,-4.46 h1.27
  text "S6" at 22.18,-12.08 h1.27
  text "S1" at 22.68,-24.78 h1.27
3D body "SEMIKRON_SKHI 21A R.stp": height 16, standoff -3.5, extent -27.5,-27.5 27.5,27.5

## SEMIKRON_SKHI 61 R [mm] "SEMIKRON SKHI 61 R Case"
height 20
pads (57):
  rect 1.9x1.9 hole 1.2: 1(-48.9,22.59) AS-1(40,22.59) B1-1(32.38,-23.15) B2-1(-3.18,-23.15) B3-1(-38.74,-23.15) T1-1(50.16,-23.15) T2-1(14.6,-23.15) T3-1(-20.96,-23.15)
  round 1.9 hole 1.2: 2(-48.9,20.05) 3(-46.36,22.59) 4(-46.36,20.05) 5(-43.82,22.59) 6(-43.82,20.05) 7(-41.28,22.59) 8(-41.28,20.05) 9(-38.74,22.59) 10(-38.74,20.05) 11(-36.2,22.59) 12(-36.2,20.05) 13(-33.66,22.59) 14(-33.66,20.05) 15(-31.12,22.59) 16(-31.12,20.05) 17(-28.58,22.59) 18(-28.58,20.05) 19(-26.04,22.59) 20(-26.04,20.05) AS-2(40,20.05) AS-3(42.54,22.59) AS-4(42.54,20.05) AS-9(50.16,22.59) B1-2(32.38,-20.61) B1-3(29.84,-23.15) B1-4(29.84,-20.61) B1-9(22.22,-23.15) B2-2(-3.18,-20.61) B2-3(-5.72,-23.15) B2-4(-5.72,-20.61) B2-9(-13.34,-23.15) B3-2(-38.74,-20.61) B3-3(-41.28,-23.15) B3-4(-41.28,-20.61) B3-9(-48.9,-23.15) T1-2(50.16,-20.61) T1-3(47.62,-23.15) T1-4(47.62,-20.61) T1-9(40,-23.15) T2-2(14.6,-20.61) T2-3(12.06,-23.15) T2-4(12.06,-20.61) T2-9(4.44,-23.15) T3-2(-20.96,-20.61) T3-3(-23.5,-23.15) T3-4(-23.5,-20.61) T3-9(-31.12,-23.15)
  round 4.5 hole 2.2: MECH1(-54.4,-1.85) MECH2(54.4,12.15)
Top Overlay:
  lines w0.2: -55.9,-4.506 -55.9,-28.35 55.9,-28.35 55.9,9.494 ; -55.9,0.806 -55.9,28.35 55.9,28.35 55.9,14.806
  text "1" at 37.1,21.79 h1.2
  text "2" at 37.1,19.25 h1.2
  text "9" at 49.674,19.67 h1.2
  text "9" at 39.514,-21.26 h1.2
  text "9" at 21.734,-21.26 h1.2
  text "9" at 3.954,-21.26 h1.2
  text "9" at -13.826,-21.26 h1.2
  text "9" at -49.386,-21.26 h1.2
  text "9" at -31.606,-21.26 h1.2
  text "1" at 52.09,-23.8 h1.2
  text "2" at 52.09,-21.26 h1.2
  text "1" at 34.31,-23.8 h1.2
  text "2" at 34.31,-21.26 h1.2
  text "1" at 16.53,-23.8 h1.2
  text "2" at 16.53,-21.26 h1.2
  text "1" at -1.25,-23.8 h1.2
  text "2" at -1.25,-21.26 h1.2
  text "1" at -19.03,-23.8 h1.2
  text "2" at -19.03,-21.26 h1.2
  text "2" at -36.81,-21.26 h1.2
  text "1" at -36.81,-23.8 h1.2
  text "TOP1" at 43.84,-27.32 h1.2
  text "BOT1" at 26.06,-27.32 h1.2
  text "TOP2" at 8.28,-27.32 h1.2
  text "BOT2" at -9.5,-27.32 h1.2
  text "TOP3" at -24.74,-27.32 h1.2
  text "BOT3" at -45.06,-27.32 h1.2
  text "ADDITIONAL SWITCH" at 36.86,25.04 h1.2
  text "PRIMARY SIDE" at -43.15,25.04 h1.2
  text "2" at -51.8,19.25 h1.2
  text "1" at -51.8,21.79 h1.2
  text "20" at -24.11,19.4 h1.2
Notvisible:
  drawing of 232 lines, arcs and shapes, not listed
Mechanical 14:
  lines w0.1: -55.9,-28.35 -55.9,-3.594 cw(c-54.4,-1.85) -55.9,-0.106 -55.9,28.35 55.9,28.35 55.9,13.894 cw(c54.4,12.15) 55.9,10.406 55.9,-28.35 -55.9,-28.35
  text "1" at 37.1,21.79 h1.2
  text "2" at 37.1,19.25 h1.2
  text "9" at 49.674,19.67 h1.2
  text "9" at 39.514,-21.26 h1.2
  text "9" at 21.734,-21.26 h1.2
  text "9" at 3.954,-21.26 h1.2
  text "9" at -13.826,-21.26 h1.2
  text "9" at -49.386,-21.26 h1.2
  text "9" at -31.606,-21.26 h1.2
  text "1" at 52.09,-23.8 h1.2
  text "2" at 52.09,-21.26 h1.2
  text "1" at 34.31,-23.8 h1.2
  text "2" at 34.31,-21.26 h1.2
  text "1" at 16.53,-23.8 h1.2
  text "2" at 16.53,-21.26 h1.2
  text "1" at -1.25,-23.8 h1.2
  text "2" at -1.25,-21.26 h1.2
  text "1" at -19.03,-23.8 h1.2
  text "2" at -19.03,-21.26 h1.2
  text "2" at -36.81,-21.26 h1.2
  text "1" at -36.81,-23.8 h1.2
  text "TOP1" at 43.84,-27.32 h1.2
  text "BOT1" at 26.06,-27.32 h1.2
  text "TOP2" at 8.28,-27.32 h1.2
  text "BOT2" at -9.5,-27.32 h1.2
  text "TOP3" at -24.74,-27.32 h1.2
  text "BOT3" at -45.06,-27.32 h1.2
  text "ADDITIONAL SWITCH" at 36.86,25.04 h1.2
  text "PRIMARY SIDE" at -43.15,25.04 h1.2
  text "2" at -51.8,19.25 h1.2
  text "1" at -51.8,21.79 h1.2
  text "20" at -24.11,19.4 h1.2
3D body "SEMIKRON_SKHI 61 R.stp": height 20, standoff -3.2, extent -56.7,-28.35 56.7,28.35

## SEMIKRON_SKHI 71 R [mm] "SEMIKRON SKHI 71 R Case"
height 20
pads (57):
  rect 1.9x1.9 hole 1.2: 1(-48.9,22.59) AS-1(40,22.59) B1-1(32.38,-23.15) B2-1(-3.18,-23.15) B3-1(-38.74,-23.15) T1-1(50.16,-23.15) T2-1(14.6,-23.15) T3-1(-20.96,-23.15)
  round 1.9 hole 1.2: 2(-48.9,20.05) 3(-46.36,22.59) 4(-46.36,20.05) 5(-43.82,22.59) 6(-43.82,20.05) 7(-41.28,22.59) 8(-41.28,20.05) 9(-38.74,22.59) 10(-38.74,20.05) 11(-36.2,22.59) 12(-36.2,20.05) 13(-33.66,22.59) 14(-33.66,20.05) 15(-31.12,22.59) 16(-31.12,20.05) 17(-28.58,22.59) 18(-28.58,20.05) 19(-26.04,22.59) 20(-26.04,20.05) AS-2(40,20.05) AS-3(42.54,22.59) AS-4(42.54,20.05) AS-9(50.16,22.59) B1-2(32.38,-20.61) B1-3(29.84,-23.15) B1-4(29.84,-20.61) B1-9(22.22,-23.15) B2-2(-3.18,-20.61) B2-3(-5.72,-23.15) B2-4(-5.72,-20.61) B2-9(-13.34,-23.15) B3-2(-38.74,-20.61) B3-3(-41.28,-23.15) B3-4(-41.28,-20.61) B3-9(-48.9,-23.15) T1-2(50.16,-20.61) T1-3(47.62,-23.15) T1-4(47.62,-20.61) T1-9(40,-23.15) T2-2(14.6,-20.61) T2-3(12.06,-23.15) T2-4(12.06,-20.61) T2-9(4.44,-23.15) T3-2(-20.96,-20.61) T3-3(-23.5,-23.15) T3-4(-23.5,-20.61) T3-9(-31.12,-23.15)
  round 4.5 hole 2.2: MECH1(-54.4,-1.85) MECH2(54.4,12.15)
Top Overlay:
  lines w0.2: -55.9,-4.506 -55.9,-28.35 55.9,-28.35 55.9,9.494 ; -55.9,0.806 -55.9,28.35 55.9,28.35 55.9,14.806
  text "1" at 37.1,21.79 h1.2
  text "2" at 37.1,19.25 h1.2
  text "9" at 49.674,19.67 h1.2
  text "9" at 39.514,-21.26 h1.2
  text "9" at 21.734,-21.26 h1.2
  text "9" at 3.954,-21.26 h1.2
  text "9" at -13.826,-21.26 h1.2
  text "9" at -49.386,-21.26 h1.2
  text "9" at -31.606,-21.26 h1.2
  text "1" at 52.09,-23.8 h1.2
  text "2" at 52.09,-21.26 h1.2
  text "1" at 34.31,-23.8 h1.2
  text "2" at 34.31,-21.26 h1.2
  text "1" at 16.53,-23.8 h1.2
  text "2" at 16.53,-21.26 h1.2
  text "1" at -1.25,-23.8 h1.2
  text "2" at -1.25,-21.26 h1.2
  text "1" at -19.03,-23.8 h1.2
  text "2" at -19.03,-21.26 h1.2
  text "2" at -36.81,-21.26 h1.2
  text "1" at -36.81,-23.8 h1.2
  text "TOP1" at 43.84,-27.32 h1.2
  text "BOT1" at 26.06,-27.32 h1.2
  text "TOP2" at 8.28,-27.32 h1.2
  text "BOT2" at -9.5,-27.32 h1.2
  text "TOP3" at -24.74,-27.32 h1.2
  text "BOT3" at -45.06,-27.32 h1.2
  text "ADDITIONAL SWITCH" at 36.86,25.04 h1.2
  text "PRIMARY SIDE" at -43.15,25.04 h1.2
  text "2" at -51.8,19.25 h1.2
  text "1" at -51.8,21.79 h1.2
  text "20" at -24.11,19.4 h1.2
Notvisible:
  drawing of 232 lines, arcs and shapes, not listed
Mechanical 14:
  lines w0.1: -55.9,-28.35 -55.9,-3.594 cw(c-54.4,-1.85) -55.9,-0.106 -55.9,28.35 55.9,28.35 55.9,13.894 cw(c54.4,12.15) 55.9,10.406 55.9,-28.35 -55.9,-28.35
  text "1" at 37.1,21.79 h1.2
  text "2" at 37.1,19.25 h1.2
  text "9" at 49.674,19.67 h1.2
  text "9" at 39.514,-21.26 h1.2
  text "9" at 21.734,-21.26 h1.2
  text "9" at 3.954,-21.26 h1.2
  text "9" at -13.826,-21.26 h1.2
  text "9" at -49.386,-21.26 h1.2
  text "9" at -31.606,-21.26 h1.2
  text "1" at 52.09,-23.8 h1.2
  text "2" at 52.09,-21.26 h1.2
  text "1" at 34.31,-23.8 h1.2
  text "2" at 34.31,-21.26 h1.2
  text "1" at 16.53,-23.8 h1.2
  text "2" at 16.53,-21.26 h1.2
  text "1" at -1.25,-23.8 h1.2
  text "2" at -1.25,-21.26 h1.2
  text "1" at -19.03,-23.8 h1.2
  text "2" at -19.03,-21.26 h1.2
  text "2" at -36.81,-21.26 h1.2
  text "1" at -36.81,-23.8 h1.2
  text "TOP1" at 43.84,-27.32 h1.2
  text "BOT1" at 26.06,-27.32 h1.2
  text "TOP2" at 8.28,-27.32 h1.2
  text "BOT2" at -9.5,-27.32 h1.2
  text "TOP3" at -24.74,-27.32 h1.2
  text "BOT3" at -45.06,-27.32 h1.2
  text "ADDITIONAL SWITCH" at 36.86,25.04 h1.2
  text "PRIMARY SIDE" at -43.15,25.04 h1.2
  text "2" at -51.8,19.25 h1.2
  text "1" at -51.8,21.79 h1.2
  text "20" at -24.11,19.4 h1.2
3D body "SEMIKRON_SKHI 71 R.stp": height 20, standoff -3.2, extent -56.7,-28.35 56.7,28.35

## SEMITEC_CRD E [mm] "CRD Diode, Lead spacing 7.62mm Body 4.2mm X 2mm, SEMITEC Case Type CRD E"
height 2
pads (2):
  round 1.5 hole 0.8: 1(-3.8,0) 2(3.8,0)
Top Overlay:
  lines w0.2: -2.66,-0.3 -2.1,-0.3 ; -2.66,0.3 -2.1,0.3 ; -1.6,-1 -1.6,1 ; -1.5,-1 -1.5,1 ; -1.4,-1 -1.4,1 ; -1.3,-1 -1.3,1 ; -1.2,-1 -1.2,1 ; -1.1,-1 -1.1,1 ; 2.1,-0.3 2.752,-0.3 ; 2.1,0.3 2.752,0.3 ; -2.1,-0.7 ccw(c-1.8,-0.7) -1.8,-1 1.8,-1 ccw(c1.8,-0.7) 2.1,-0.7 2.1,0.7 ccw(c1.8,0.7) 1.8,1 -1.8,1 ccw(c-1.8,0.7) -2.1,0.7 -2.1,-0.7
Mechanical 14:
  lines w0.1: -2.1,-0.3 -3.81,-0.3 cw(c-3.81,0) -3.81,0.3 -2.1,0.3 ; -1.6,-1 -1.6,1 ; -1.55,-1 -1.55,1 ; -1.5,-1 -1.5,1 ; -1.45,-1 -1.45,1 ; -1.4,-1 -1.4,1 ; -1.35,-1 -1.35,1 ; -1.3,-1 -1.3,1 ; -1.25,-1 -1.25,1 ; -1.2,-1 -1.2,1 ; -1.15,-1 -1.15,1 ; -1.1,-1 -1.1,1 ; 2.1,-0.3 3.81,-0.3 ccw(c3.81,0) 3.81,0.3 2.1,0.3 ; -2.1,-0.7 ccw(c-1.8,-0.7) -1.8,-1 1.8,-1 ccw(c1.8,-0.7) 2.1,-0.7 2.1,0.7 ccw(c1.8,0.7) 1.8,1 -1.8,1 ccw(c-1.8,0.7) -2.1,0.7 -2.1,-0.7
3D body "E-103.stp": height 2, standoff -3.1, extent -4.11,-1 4.11,1

## SFH250 [mm] "Fiber Optic Photodiode Detector"
height 7.55
pads (2):
  round 1.7 hole 1: 1(0,1.27) 2(0,-1.27)
Top Overlay:
  lines w0.2: -1.852,-0.254 -0.836,-0.254 ; -1.344,-0.635 -1.344,-0.254 ; -1.344,0.254 -1.344,0.635 ; 2.3,-2.25 1.1,-2.25 1.1,2.75 2.3,2.75 2.3,-2.375 6,-2.375 ; 2.3,2.375 6,2.375 ; 9,-2.375 9.9,-2.375 ; 9,2.375 9.9,2.375 ; -1.344,-0.254 -0.836,0.254 -1.852,0.254 -1.344,-0.254 ; 9.9,-2.375 9.9,2.375 ; 9.9,-2.375 10.1,-2.175 10.1,2.175 9.9,2.375
Notvisible:
  lines w0.1: -1,-1.27 0,-1.27 ; -1,0 0,0 ; -1,1.27 0,1.27 ; 0,-2.27 0,-1.27 ; 0,-1 0,0 ; 0,-0.27 0,-1.27 ; 0,0.27 0,1.27 ; 0,1 0,0 ; 0,2.27 0,1.27 ; 1,-1.27 0,-1.27 ; 1,0 0,0 ; 1,1.27 0,1.27
Mechanical 14:
  lines w0.1: -1.344,-0.635 -1.344,-0.254 ; -1.344,0.254 -1.344,0.635 ; 1.1,-1.526 -0.25,-1.526 -0.25,-1.014 1.1,-1.014 ; 1.1,1.014 -0.25,1.014 -0.25,1.526 1.1,1.526 ; 2.3,-2.25 1.1,-2.25 1.1,2.75 2.3,2.75 2.3,-2.375 9.9,-2.375 ; 2.3,2.375 9.9,2.375 ; -1.852,-0.254 -0.836,-0.254 ; -1.852,-0.254 -0.836,-0.254 ; -1.852,-0.254 -0.836,-0.254 ; -1.852,0.254 -0.836,0.254 ; -1.852,0.254 -1.344,-0.254 ; -1.852,0.254 -1.344,-0.254 ; -1.852,0.254 -0.836,0.254 ; -1.852,0.254 -0.836,0.254 ; -1.852,0.254 -1.344,-0.254 ; -1.344,-0.254 -0.836,0.254 ; -1.344,-0.254 -0.836,0.254 ; -1.344,-0.254 -0.836,0.254 ; 9.9,-2.375 9.9,2.375 ; 9.9,-2.375 10.1,-2.175 10.1,2.175 9.9,2.375
3D body "SFH250.stp": height 7.55, standoff -3.2, extent -0.25,-2.375 10.1,2.75